# Altium footprint library con-amp.PCBLIB: 295 footprints (part 8 of 19)
Each footprint in its own frame and in the unit in brackets; x right, y up, seen from the top. Pads: shape width x height; smd on the part's side, far side on the other; paste and mask are expansions set on the pad; w line width, h text height; cw(c..) or ccw(c..) is an arc to the next point about the centre after c.
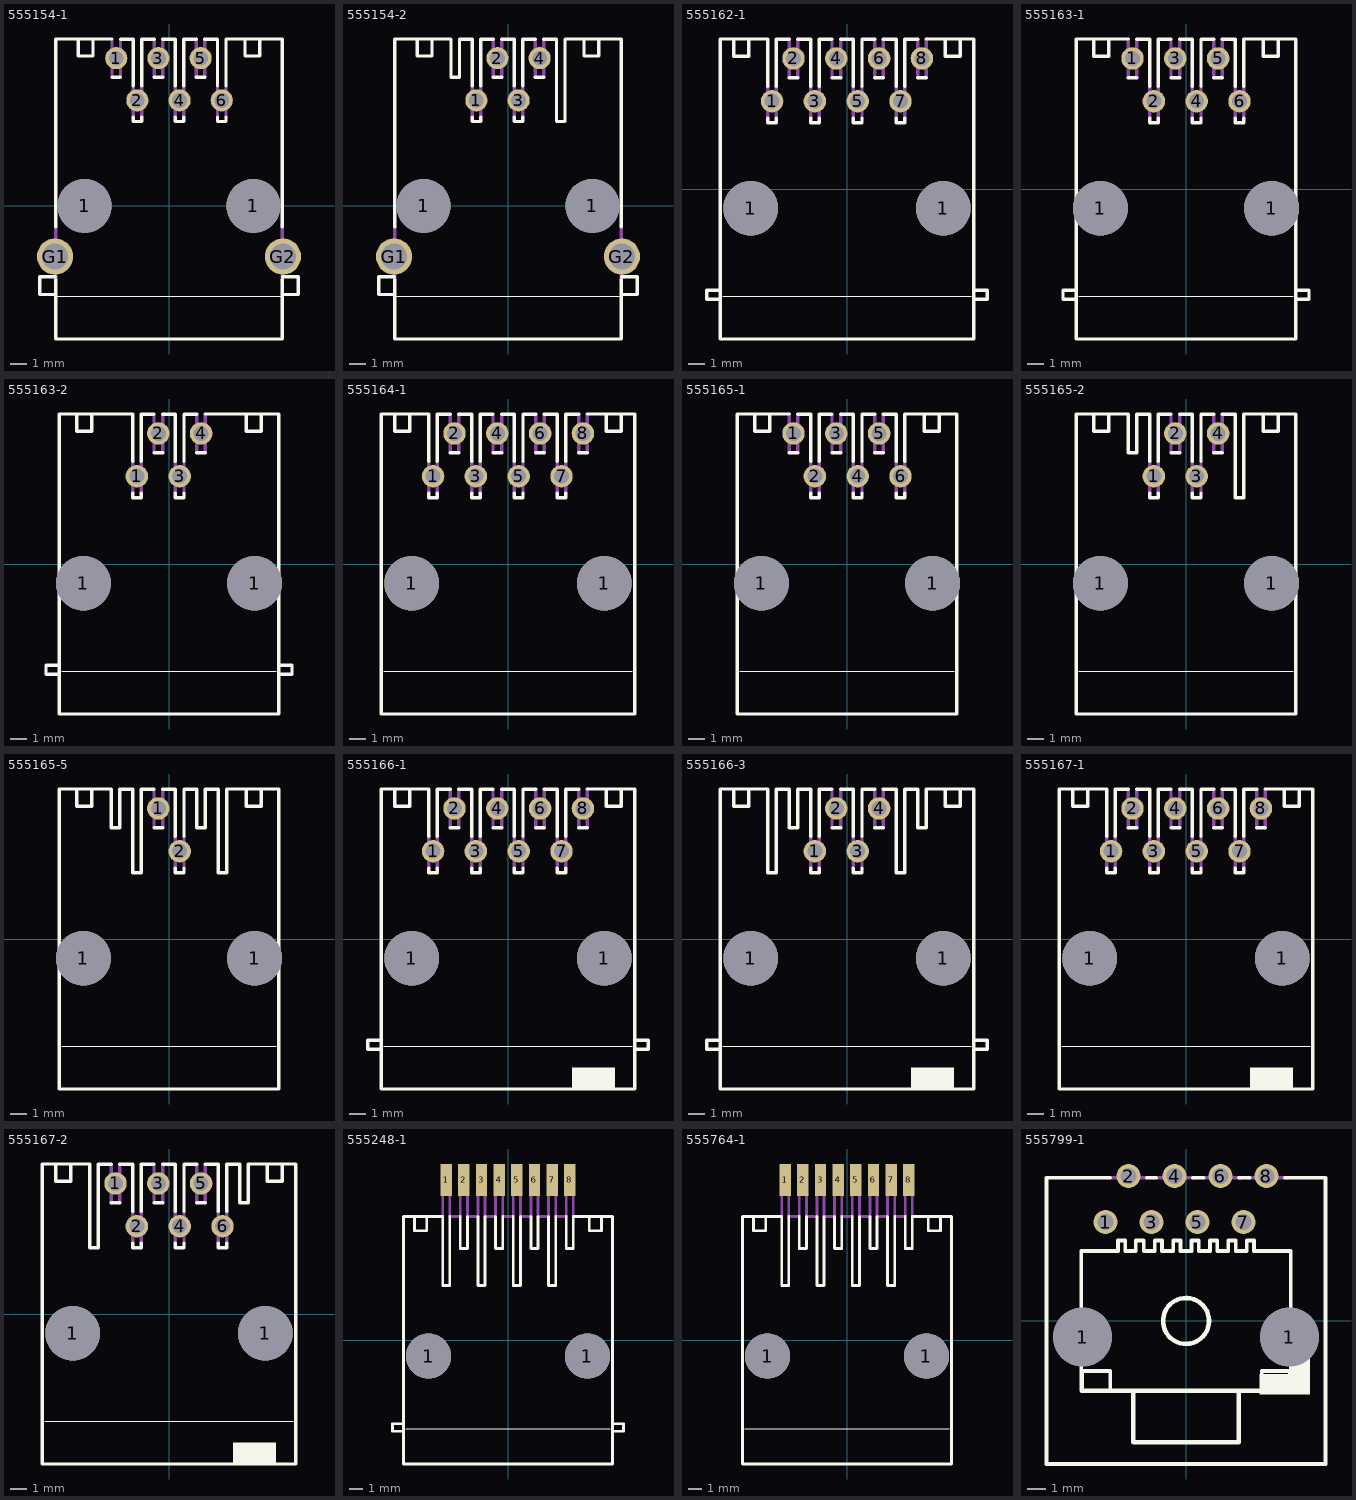
[diagram p7: the footprints below, top view; thin cyan lines are the x and y axes]

## 555154-1 [mil]
pads (10):
  round 128 hole 128: 1(-200,0) 1(200,0)
  round 52.5 hole 35: 1(-125,350) 2(-75,250) 3(-25,350) 4(25,250) 5(75,350) 6(125,250)
  round 86 hole 62: G1(-270,-120) G2(270,-120)
Top Overlay:
  lines w2: -270,-214 270,-214
  lines w8: -268.86,-168.23 -306.42,-168.23 -306.42,-209.88 -268.82,-209.88 ; -267.91,-175 -267.91,-315.39 267.91,-315.39 267.91,-175 ; -267.91,-50 -267.91,395.39 -135,395.39 ; -215,395 -215,355 -180,355 -180,395 ; -135,305 -115,305 ; -115,395 -85,395 -85,285 ; -85,210 -85,200 -65,200 -65,210 ; -65,285 -65,395.39 ; -65,395 -35,395 ; -35,305 -15,305 ; -15,395 15,395 15,285 ; 15,210 15,200 35,200 35,210 ; 35,285 35,395.39 ; 35,395 65,395 ; 65,305 85,305 ; 85,395 115,395 115,285 ; 115,210 115,200 135,200 135,210 ; 135,285 135,395.39 267.91,395.39 267.91,-50 ; 180,395 180,355 215,355 215,395 ; 269.8,-209.88 306.42,-209.88 306.42,-168.23 269.84,-168.23
Mechanical 16:
  lines w8: -268,-175 -268,-50 ; -135,305 -135,395.39 ; -115,305 -115,395 ; -85,210 -85,285 ; -65,210 -65,285 ; -35,305 -35,395 ; -15,305 -15,395 ; 15,210 15,285 ; 35,210 35,285 ; 65,305 65,395 ; 85,305 85,395 ; 115,210 115,285 ; 135,210 135,285 ; 268,-177 268,-45

## 555154-2 [mil]
pads (8):
  round 128 hole 128: 1(-200,0) 1(200,0)
  round 52.5 hole 35: 1(-75,250) 2(-25,350) 3(25,250) 4(75,350)
  round 86 hole 62: G1(-270,-120) G2(270,-120)
Top Overlay:
  lines w2: -270,-214 270,-214
  lines w8: -268.86,-168.23 -306.42,-168.23 -306.42,-209.88 -268.82,-209.88 ; -267.91,-175 -267.91,-315.39 267.91,-315.39 267.91,-175 ; -267.91,-50 -267.91,395.39 -135,395.39 -135,305 -115,305 -115,395 -85,395 -85,285 ; -215,395 -215,355 -180,355 -180,395 ; -85,210 -85,200 -65,200 -65,210 ; -65,285 -65,395.39 ; -65,395 -35,395 ; -35,305 -15,305 ; -15,395 15,395 15,285 ; 15,210 15,200 35,200 35,210 ; 35,285 35,395.39 ; 35,395 65,395 ; 65,305 85,305 ; 85,395 115,395 115,200 135,200 135,395.39 267.91,395.39 267.91,-50 ; 180,395 180,355 215,355 215,395 ; 269.8,-209.88 306.42,-209.88 306.42,-168.23 269.84,-168.23
Mechanical 16:
  lines w8: -268,-175 -268,-50 ; -85,210 -85,285 ; -65,210 -65,285 ; -35,305 -35,395 ; -15,305 -15,395 ; 15,210 15,285 ; 35,210 35,285 ; 65,305 65,395 ; 85,305 85,395 ; 268,-177 268,-45

## 555162-1 [mil]
pads (10):
  round 128 hole 128: 1(-225,-45) 1(225,-45)
  round 52.5 hole 35: 1(-175,205) 2(-125,305) 3(-75,205) 4(-25,305) 5(25,205) 6(75,305) 7(125,205) 8(175,305)
Top Overlay:
  lines w2: -290,-250 290,-250
  lines w8: -301.81,-257.87 -327.4,-257.87 -327.4,-236.22 -299.84,-236.22 ; -265,350 -265,310 -230,310 -230,350 ; -185,165 -185,155 -165,155 -165,165 ; -185,240 -185,350 ; -185,350.39 -295.91,350.39 -295.91,-350.39 295.91,-350.39 295.91,350.39 185,350.39 ; -165,240 -165,350.39 ; -165,350 -135,350 ; -135,260 -115,260 ; -115,350 -85,350 -85,240 ; -85,165 -85,155 -65,155 -65,165 ; -65,240 -65,350.39 ; -65,350 -35,350 ; -35,260 -15,260 ; -15,350 15,350 15,240 ; 15,165 15,155 35,155 35,165 ; 35,240 35,350 ; 35,350.39 35,350 ; 65,260 85,260 ; 65,350 35,350 ; 85,350 115,350 115,240 ; 115,165 115,155 135,155 135,165 ; 135,240 135,350.39 ; 135,350 165,350 ; 165,260 185,260 ; 230,350 230,310 265,310 265,350 ; 299.84,-236.22 327.4,-236.22 327.4,-257.87 301.81,-257.87
Mechanical 16:
  lines w8: -185,165 -185,240 ; -165,165 -165,240 ; -135,260 -135,350 ; -115,260 -115,350 ; -85,165 -85,240 ; -65,165 -65,240 ; -35,260 -35,350 ; -15,260 -15,350 ; 15,165 15,240 ; 35,165 35,240 ; 65,260 65,350 ; 85,260 85,350 ; 115,165 115,240 ; 135,165 135,240 ; 165,260 165,350 ; 185,260 185,350

## 555163-1 [mil]
pads (8):
  round 128 hole 128: 1(-200,-45) 1(200,-45)
  round 52.5 hole 35: 1(-125,305) 2(-75,205) 3(-25,305) 4(25,205) 5(75,305) 6(125,205)
Top Overlay:
  lines w2: -250,-250 250,-250
  lines w8: -261.81,-257.87 -287.4,-257.87 -287.4,-236.22 -259.84,-236.22 ; -215,350 -215,310 -180,310 -180,350 ; -135,260 -115,260 ; -135,350.39 -255.91,350.39 -255.91,-350.39 255.91,-350.39 255.91,350.39 135,350.39 135,240 ; -115,350 -85,350 -85,240 ; -85,165 -85,155 -65,155 -65,165 ; -65,240 -65,350.39 ; -65,350 -35,350 ; -35,260 -15,260 ; -15,350 15,350 15,240 ; 15,165 15,155 35,155 35,165 ; 35,240 35,350.39 ; 35,350 65,350 ; 65,260 85,260 ; 85,350 115,350 115,240 ; 115,165 115,155 135,155 135,165 ; 180,350 180,310 215,310 215,350 ; 259.84,-236.22 287.4,-236.22 287.4,-257.87 261.81,-257.87
Mechanical 16:
  lines w8: -135,260 -135,350.39 ; -115,260 -115,350 ; -85,165 -85,240 ; -65,165 -65,240 ; -35,260 -35,350 ; -15,260 -15,350 ; 15,165 15,240 ; 35,165 35,240 ; 65,260 65,350 ; 85,260 85,350 ; 115,165 115,240 ; 135,165 135,240

## 555163-2 [mil]
pads (6):
  round 128 hole 128: 1(-200,-45) 1(200,-45)
  round 52.5 hole 35: 1(-75,205) 2(-25,305) 3(25,205) 4(75,305)
Top Overlay:
  lines w2: -250,-250 250,-250
  lines w8: -261.81,-257.87 -287.4,-257.87 -287.4,-236.22 -259.84,-236.22 ; -215,350 -215,310 -180,310 -180,350 ; -85,165 -85,155 -65,155 -65,165 ; -85,240 -85,350 ; -85,350.39 -255.91,350.39 -255.91,-350.39 255.91,-350.39 255.91,350.39 85,350.39 ; -65,240 -65,350.39 ; -65,350 -35,350 ; -35,260 -15,260 ; -15,350 15,350 15,240 ; 15,165 15,155 35,155 35,165 ; 35,240 35,350.39 ; 35,350 65,350 ; 65,260 85,260 ; 180,350 180,310 215,310 215,350 ; 259.84,-236.22 287.4,-236.22 287.4,-257.87 261.81,-257.87
Mechanical 16:
  lines w8: -85,165 -85,240 ; -65,165 -65,240 ; -35,260 -35,350 ; -15,260 -15,350 ; 15,165 15,240 ; 35,165 35,240 ; 65,260 65,350 ; 85,260 85,350

## 555164-1 [mil]
pads (10):
  round 128 hole 128: 1(-225,-45) 1(225,-45)
  round 52.5 hole 35: 1(-175,205) 2(-125,305) 3(-75,205) 4(-25,305) 5(25,205) 6(75,305) 7(125,205) 8(175,305)
Top Overlay:
  lines w2: -290,-250 290,-250
  lines w8: -265,350 -265,310 -230,310 -230,350 ; -185,165 -185,155 -165,155 -165,165 ; -185,240 -185,350 ; -185,350.39 -295.91,350.39 -295.91,-350.39 295.91,-350.39 295.91,350.39 185,350.39 ; -165,240 -165,350.39 ; -165,350 -135,350 ; -135,260 -115,260 ; -115,350 -85,350 -85,240 ; -85,165 -85,155 -65,155 -65,165 ; -65,240 -65,350.39 ; -65,350 -35,350 ; -35,260 -15,260 ; -15,350 15,350 15,240 ; 15,165 15,155 35,155 35,165 ; 35,240 35,350 ; 35,350.39 35,350 ; 65,260 85,260 ; 65,350 35,350 ; 85,350 115,350 115,240 ; 115,165 115,155 135,155 135,165 ; 135,240 135,350.39 ; 135,350 165,350 ; 165,260 185,260 ; 230,350 230,310 265,310 265,350
Mechanical 16:
  lines w8: -185,165 -185,240 ; -165,165 -165,240 ; -135,260 -135,350 ; -115,260 -115,350 ; -85,165 -85,240 ; -65,165 -65,240 ; -35,260 -35,350 ; -15,260 -15,350 ; 15,165 15,240 ; 35,165 35,240 ; 65,260 65,350 ; 85,260 85,350 ; 115,165 115,240 ; 135,165 135,240 ; 165,260 165,350 ; 185,260 185,350

## 555165-1 [mil]
pads (8):
  round 128 hole 128: 1(-200,-45) 1(200,-45)
  round 52.5 hole 35: 1(-125,305) 2(-75,205) 3(-25,305) 4(25,205) 5(75,305) 6(125,205)
Top Overlay:
  lines w2: -250,-250 250,-250
  lines w8: -215,350 -215,310 -180,310 -180,350 ; -135,260 -115,260 ; -135,350.39 -255.91,350.39 -255.91,-350.39 255.91,-350.39 255.91,350.39 135,350.39 135,240 ; -115,350 -85,350 -85,240 ; -85,165 -85,155 -65,155 -65,165 ; -65,240 -65,350.39 ; -65,350 -35,350 ; -35,260 -15,260 ; -15,350 15,350 15,240 ; 15,165 15,155 35,155 35,165 ; 35,240 35,350.39 ; 35,350 65,350 ; 65,260 85,260 ; 85,350 115,350 115,240 ; 115,165 115,155 135,155 135,165 ; 180,350 180,310 215,310 215,350
Mechanical 16:
  lines w8: -135,260 -135,350.39 ; -115,260 -115,350 ; -85,165 -85,240 ; -65,165 -65,240 ; -35,260 -35,350 ; -15,260 -15,350 ; 15,165 15,240 ; 35,165 35,240 ; 65,260 65,350 ; 85,260 85,350 ; 115,165 115,240 ; 135,165 135,240

## 555165-2 [mil]
pads (6):
  round 128 hole 128: 1(-200,-45) 1(200,-45)
  round 52.5 hole 35: 1(-75,205) 2(-25,305) 3(25,205) 4(75,305)
Top Overlay:
  lines w2: -250,-250 250,-250
  lines w8: -215,350 -215,310 -180,310 -180,350 ; -85,165 -85,155 -65,155 -65,165 ; -85,240 -85,350 -115,350 -115,260 -135,260 -135,350.39 -255.91,350.39 -255.91,-350.39 255.91,-350.39 255.91,350.39 135,350.39 135,155 115,155 115,350 85,350 ; -65,240 -65,350.39 ; -65,350 -35,350 ; -35,260 -15,260 ; -15,350 15,350 15,240 ; 15,165 15,155 35,155 35,165 ; 35,240 35,350.39 ; 35,350 65,350 ; 65,260 85,260 ; 180,350 180,310 215,310 215,350
Mechanical 16:
  lines w8: -85,165 -85,240 ; -65,165 -65,240 ; -35,260 -35,350 ; -15,260 -15,350 ; 15,165 15,240 ; 35,165 35,240 ; 65,260 65,350 ; 85,260 85,350

## 555165-5 [mil]
pads (4):
  round 128 hole 128: 1(-200,-45) 1(200,-45)
  round 52.5 hole 35: 1(-25,305) 2(25,205)
Top Overlay:
  lines w2: -250,-250 250,-250
  lines w8: -215,350 -215,310 -180,310 -180,350 ; -65,350 -35,350 ; -65,350.39 -65,155 -85,155 -85,350 -115,350 -115,260 -135,260 -135,350.39 -255.91,350.39 -255.91,-350.39 255.91,-350.39 255.91,350.39 135,350.39 135,155 115,155 115,350 85,350 85,260 65,260 65,350 35,350 ; -35,260 -15,260 ; -15,350 15,350 15,240 ; 15,165 15,155 35,155 35,165 ; 35,240 35,350.39 ; 180,350 180,310 215,310 215,350
Mechanical 16:
  lines w8: -35,260 -35,350 ; -15,260 -15,350 ; 15,165 15,240 ; 35,165 35,240

## 555166-1 [mil]
pads (10):
  round 128 hole 128: 1(-225,-45) 1(225,-45)
  round 52.5 hole 35: 1(-175,205) 2(-125,305) 3(-75,205) 4(-25,305) 5(25,205) 6(75,305) 7(125,205) 8(175,305)
Top Overlay:
  rectangle: 150,-350 250,-300
  lines w2: -290,-250 290,-250
  lines w8: -301.81,-257.87 -327.4,-257.87 -327.4,-236.22 -299.84,-236.22 ; -265,350 -265,310 -230,310 -230,350 ; -185,165 -185,155 -165,155 -165,165 ; -185,240 -185,350 ; -185,350.39 -295.91,350.39 -295.91,-350.39 295.91,-350.39 295.91,350.39 185,350.39 ; -165,240 -165,350.39 ; -165,350 -135,350 ; -135,260 -115,260 ; -115,350 -85,350 -85,240 ; -85,165 -85,155 -65,155 -65,165 ; -65,240 -65,350.39 ; -65,350 -35,350 ; -35,260 -15,260 ; -15,350 15,350 15,240 ; 15,165 15,155 35,155 35,165 ; 35,240 35,350 ; 35,350.39 35,350 ; 65,260 85,260 ; 65,350 35,350 ; 85,350 115,350 115,240 ; 115,165 115,155 135,155 135,165 ; 135,240 135,350.39 ; 135,350 165,350 ; 165,260 185,260 ; 230,350 230,310 265,310 265,350 ; 299.84,-236.22 327.4,-236.22 327.4,-257.87 301.81,-257.87
Mechanical 16:
  lines w8: -185,165 -185,240 ; -165,165 -165,240 ; -135,260 -135,350 ; -115,260 -115,350 ; -85,165 -85,240 ; -65,165 -65,240 ; -35,260 -35,350 ; -15,260 -15,350 ; 15,165 15,240 ; 35,165 35,240 ; 65,260 65,350 ; 85,260 85,350 ; 115,165 115,240 ; 135,165 135,240 ; 165,260 165,350 ; 185,260 185,350

## 555166-3 [mil]
pads (6):
  round 128 hole 128: 1(-225,-45) 1(225,-45)
  round 52.5 hole 35: 1(-75,205) 2(-25,305) 3(25,205) 4(75,305)
Top Overlay:
  rectangle: 150,-350 250,-300
  lines w2: -290,-250 290,-250
  lines w8: -301.81,-257.87 -327.4,-257.87 -327.4,-236.22 -299.84,-236.22 ; -265,350 -265,310 -230,310 -230,350 ; -185,350 -185,155 -165,155 -165,350.39 ; -185,350.39 -295.91,350.39 -295.91,-350.39 295.91,-350.39 295.91,350.39 185,350.39 ; -165,350 -135,350 -135,260 -115,260 -115,350 -85,350 -85,240 ; -85,165 -85,155 -65,155 -65,165 ; -65,240 -65,350.39 ; -65,350 -35,350 ; -35,260 -15,260 ; -15,350 15,350 15,240 ; 15,165 15,155 35,155 35,165 ; 35,240 35,350 ; 35,350.39 35,350 ; 65,260 85,260 ; 65,350 35,350 ; 85,350 115,350 115,155 135,155 135,350.39 ; 135,350 165,350 165,260 185,260 185,350 ; 230,350 230,310 265,310 265,350 ; 299.84,-236.22 327.4,-236.22 327.4,-257.87 301.81,-257.87
Mechanical 16:
  lines w8: -85,165 -85,240 ; -65,165 -65,240 ; -35,260 -35,350 ; -15,260 -15,350 ; 15,165 15,240 ; 35,165 35,240 ; 65,260 65,350 ; 85,260 85,350

## 555167-1 [mil]
pads (10):
  round 128 hole 128: 1(-225,-45) 1(225,-45)
  round 52.5 hole 35: 1(-175,205) 2(-125,305) 3(-75,205) 4(-25,305) 5(25,205) 6(75,305) 7(125,205) 8(175,305)
Top Overlay:
  rectangle: 150,-350 250,-300
  lines w2: -290,-250 290,-250
  lines w8: -265,350 -265,310 -230,310 -230,350 ; -185,165 -185,155 -165,155 -165,165 ; -185,240 -185,350 ; -185,350.39 -295.91,350.39 -295.91,-350.39 295.91,-350.39 295.91,350.39 185,350.39 ; -165,240 -165,350.39 ; -165,350 -135,350 ; -135,260 -115,260 ; -115,350 -85,350 -85,240 ; -85,165 -85,155 -65,155 -65,165 ; -65,240 -65,350.39 ; -65,350 -35,350 ; -35,260 -15,260 ; -15,350 15,350 15,240 ; 15,165 15,155 35,155 35,165 ; 35,240 35,350 ; 35,350.39 35,350 ; 65,260 85,260 ; 65,350 35,350 ; 85,350 115,350 115,240 ; 115,165 115,155 135,155 135,165 ; 135,240 135,350.39 ; 135,350 165,350 ; 165,260 185,260 ; 230,350 230,310 265,310 265,350
Mechanical 16:
  lines w8: -185,165 -185,240 ; -165,165 -165,240 ; -135,260 -135,350 ; -115,260 -115,350 ; -85,165 -85,240 ; -65,165 -65,240 ; -35,260 -35,350 ; -15,260 -15,350 ; 15,165 15,240 ; 35,165 35,240 ; 65,260 65,350 ; 85,260 85,350 ; 115,165 115,240 ; 135,165 135,240 ; 165,260 165,350 ; 185,260 185,350

## 555167-2 [mil]
pads (8):
  round 128 hole 128: 1(-225,-45) 1(225,-45)
  round 52.5 hole 35: 1(-125,305) 2(-75,205) 3(-25,305) 4(25,205) 5(75,305) 6(125,205)
Top Overlay:
  rectangle: 150,-350 250,-300
  lines w2: -290,-250 290,-250
  lines w8: -265,350 -265,310 -230,310 -230,350 ; -185,350 -185,155 -165,155 -165,350.39 ; -185,350.39 -295.91,350.39 -295.91,-350.39 295.91,-350.39 295.91,350.39 185,350.39 ; -165,350 -135,350 ; -135,260 -115,260 ; -115,350 -85,350 -85,240 ; -85,165 -85,155 -65,155 -65,165 ; -65,240 -65,350.39 ; -65,350 -35,350 ; -35,260 -15,260 ; -15,350 15,350 15,240 ; 15,165 15,155 35,155 35,165 ; 35,240 35,350 ; 35,350.39 35,350 ; 65,260 85,260 ; 65,350 35,350 ; 85,350 115,350 115,240 ; 115,165 115,155 135,155 135,165 ; 135,240 135,350.39 ; 135,350 165,350 165,260 185,260 185,350 ; 230,350 230,310 265,310 265,350
Mechanical 16:
  lines w8: -135,260 -135,350 ; -115,260 -115,350 ; -85,165 -85,240 ; -65,165 -65,240 ; -35,260 -35,350 ; -15,260 -15,350 ; 15,165 15,240 ; 35,165 35,240 ; 65,260 65,350 ; 85,260 85,350 ; 115,165 115,240 ; 135,165 135,240

## 555248-1 [mil]
pads (10):
  round 128 hole 128: 1(-225,-45) 1(225,-45)
  rect 32x90 smd: 1(-175,454.06) 2(-125,454.06) 3(-75,454.06) 4(-25,454.06) 5(25,454.06) 6(75,454.06) 7(125,454.06) 8(175,454.06)
Top Overlay:
  lines w2: -290,-250 290,-250
  lines w8: -301.81,-257.87 -327.4,-257.87 -327.4,-236.22 -299.84,-236.22 ; -265,350 -265,310 -230,310 -230,350 ; -185,350 -185,155 -165,155 -165,350.39 ; -185,350.39 -295.91,350.39 -295.91,-350.39 295.91,-350.39 295.91,350.39 185,350.39 ; -135,350 -135,260 -115,260 -115,350 ; -85,350 -85,155 -65,155 -65,350.39 ; -35,350 -35,260 -15,260 -15,350 ; 15,350 15,155 35,155 35,350.39 ; 65,350 65,260 85,260 85,350 ; 115,350 115,155 135,155 135,350.39 ; 165,350 165,260 185,260 185,350 ; 230,350 230,310 265,310 265,350 ; 299.84,-236.22 327.4,-236.22 327.4,-257.87 301.81,-257.87
Mechanical 16:
  lines w8: -185,350 -185,494.06 -165,494.06 -165,350 -135,350 -135,494.06 -115,494.06 -115,350 -85,350 -85,494.06 -65,494.06 -65,350 -35,350 -35,494.06 -15,494.06 -15,350 15,350 15,494.06 35,494.06 35,350 65,350 65,494.06 85,494.06 85,350 115,350 115,494.06 135,494.06 135,350 165,350 165,494.06 185,494.06 185,350

## 555764-1 [mil]
pads (10):
  round 128 hole 128: 1(-225,-45) 1(225,-45)
  rect 32x90 smd: 1(-175,454.06) 2(-125,454.06) 3(-75,454.06) 4(-25,454.06) 5(25,454.06) 6(75,454.06) 7(125,454.06) 8(175,454.06)
Top Overlay:
  lines w2: -290,-250 290,-250
  lines w8: -265,350 -265,310 -230,310 -230,350 ; -185,350 -185,155 -165,155 -165,350.39 ; -185,350.39 -295.91,350.39 -295.91,-350.39 295.91,-350.39 295.91,350.39 185,350.39 ; -135,350 -135,260 -115,260 -115,350 ; -85,350 -85,155 -65,155 -65,350.39 ; -35,350 -35,260 -15,260 -15,350 ; 15,350 15,155 35,155 35,350.39 ; 65,350 65,260 85,260 85,350 ; 115,350 115,155 135,155 135,350.39 ; 165,350 165,260 185,260 185,350 ; 230,350 230,310 265,310 265,350
Mechanical 16:
  lines w8: -185,350 -185,494.06 -165,494.06 -165,350 -135,350 -135,494.06 -115,494.06 -115,350 -85,350 -85,494.06 -65,494.06 -65,350 -35,350 -35,494.06 -15,494.06 -15,350 15,350 15,494.06 35,494.06 35,350 65,350 65,494.06 85,494.06 85,350 115,350 115,494.06 135,494.06 135,350 165,350 165,494.06 185,494.06 185,350

## 555799-1 [mil]
pads (10):
  round 128 hole 128: 1(-225,-35) 1(225,-35)
  round 52.5 hole 35: 1(-175,215) 2(-125,315) 3(-75,215) 4(-25,315) 5(25,215) 6(75,315) 7(125,215) 8(175,315)
Top Overlay:
  circle w10: c0,0 r50
  rectangle: 160,-160 230,-115
  rectangle: 225,-160 270,-70
  lines w8: -165,-152 -165,-109 -228,-109 -228,152 -148,152 -148,175 -132,175 -132,152 -109,152 -109,175 -92,175 -92,152 -68,152 -68,175 -52,175 -52,152 -28,152 -28,175 -12,175 -12,152 12,152 12,175 28,175 28,152 52,152 52,175 68,175 68,152 92,152 92,175 108,175 108,152 132,152 132,175 148,175 148,152 228,152 228,-109 165,-109 165,-152 ; -165,311.02 -303.35,311.02 -303.35,-311.02 303.35,-311.02 303.35,311.02 215,311.02 ; -85,311.02 -65,311.02 ; 15,311.02 38.35,311.02 ; 115,311.02 138.35,311.02
  lines w10: -227,-110 -227,-152 227,-152 227,-111 ; -115,-154 -115,-264 115,-264 115,-154
Mechanical 16:
  lines w8: -170,311.02 -85,311.02 ; -65,311.02 20,311.02 ; 35,311.02 120,311.02 ; 135,311.02 220,311.02